# Altium footprint library USER_Lib.PcbLib: 109 footprints (part 7 of 7)
Each footprint in its own frame and in the unit in brackets; x right, y up, seen from the top. Pads: shape width x height; smd on the part's side, far side on the other; paste and mask are expansions set on the pad; w line width, h text height; cw(c..) or ccw(c..) is an arc to the next point about the centre after c.
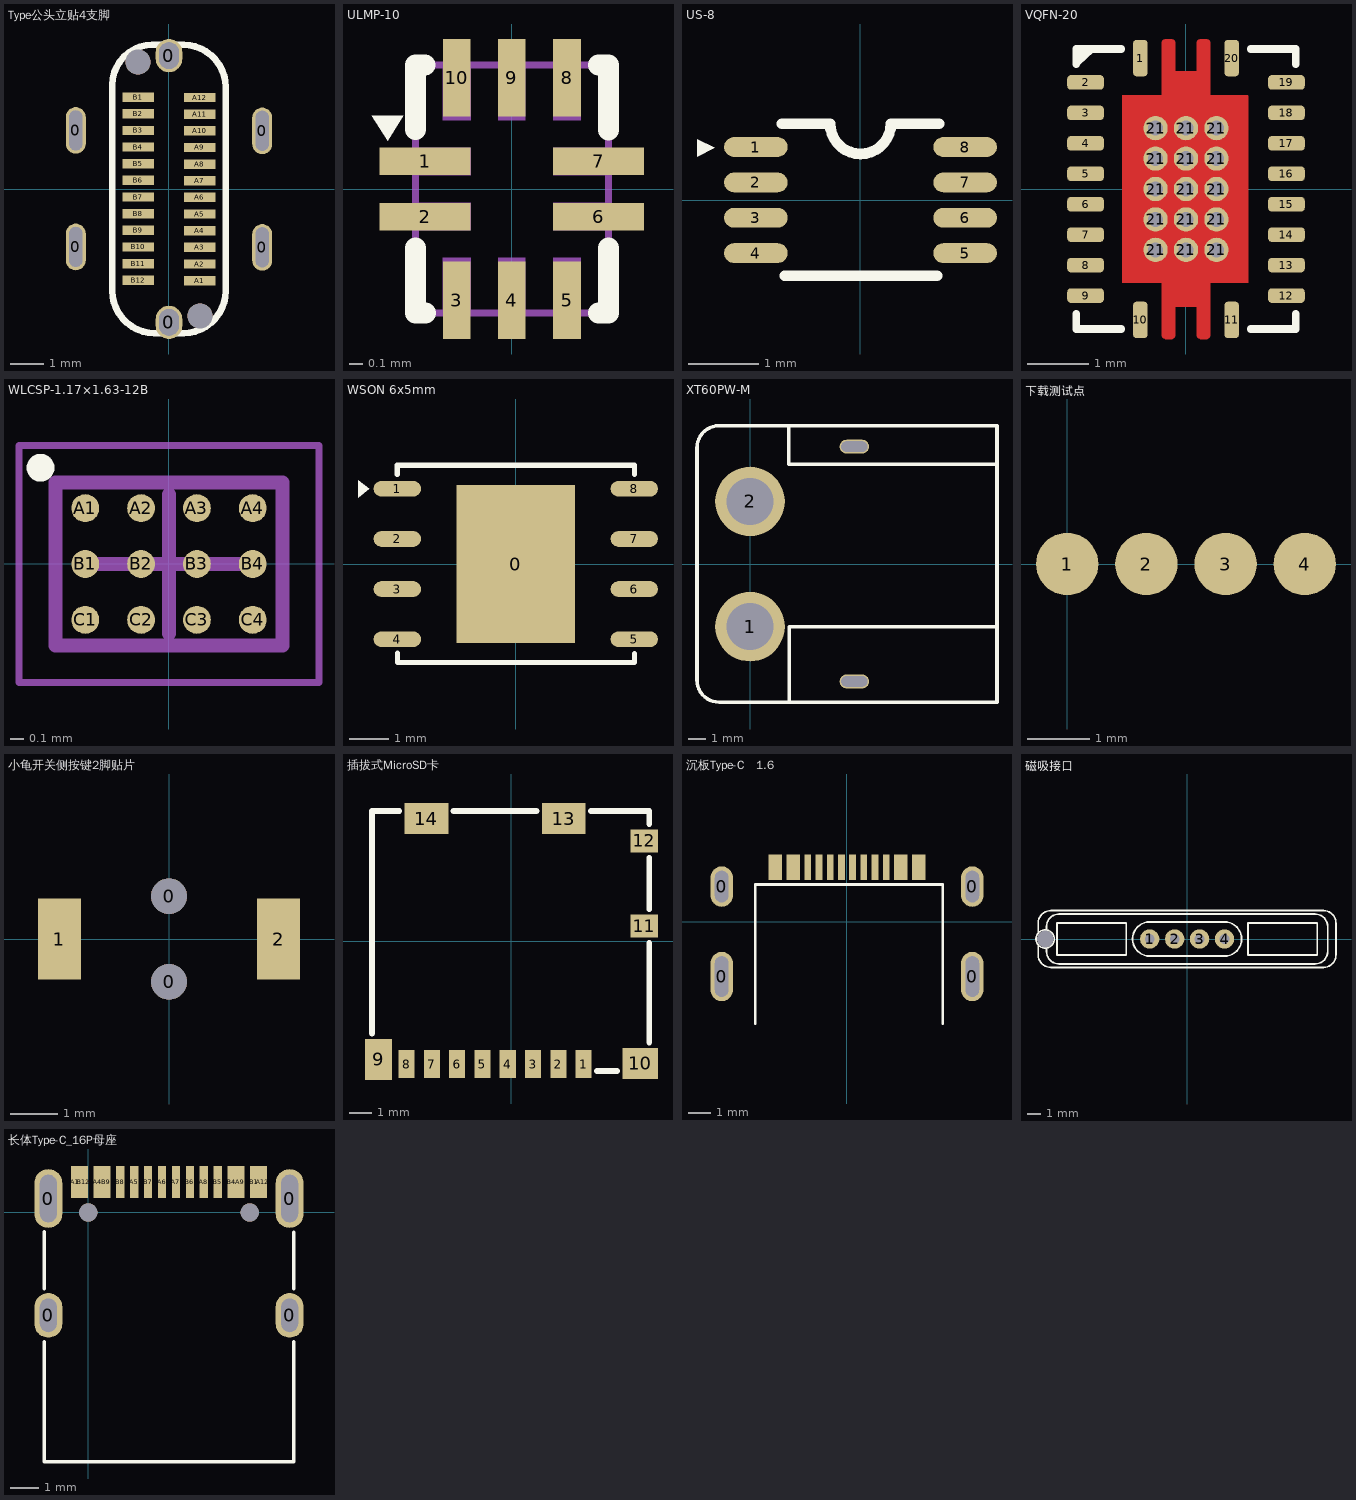
[diagram p6: the footprints below, top view; thin cyan lines are the x and y axes]

## Type公头立贴4支脚 [mm]
pads (32):
  oval 0.6x1.4 hole 0.4 slot 1.2 at 90 deg mask+0.102: 0(-2.8,-1.741) 0(-2.8,1.759) 0(2.8,-1.753) 0(2.8,1.747)
  oval 0.8x1 hole 0.6 slot 0.8 at 90 deg mask+0.102: 0(0,-4.005) 0(0,4.005)
  rect 0.95x0.28 smd mask+0.102: A1(0.925,-2.753) A2(0.925,-2.253) A3(0.925,-1.753) A4(0.925,-1.253) A5(0.925,-0.753) A6(0.925,-0.253) A7(0.925,0.247) A8(0.925,0.747) A9(0.925,1.247) A10(0.925,1.747) A11(0.925,2.247) A12(0.925,2.747) B1(-0.925,2.759) B2(-0.925,2.259) B3(-0.925,1.759) B4(-0.925,1.259) B5(-0.925,0.759) B6(-0.925,0.259) B7(-0.925,-0.241) B8(-0.925,-0.741) B9(-0.925,-1.241) B10(-0.925,-1.741) B11(-0.925,-2.241) B12(-0.925,-2.741)
  round 0.75 hole 0.75 unplated mask+0.102: ""(-0.93,3.81) ""(0.93,-3.81)
Top Overlay:
  lines w0.203: -1.702,-3.06 ccw(c-0.432,-3.06) -0.432,-4.33 0.432,-4.33 ccw(c0.432,-3.06) 1.702,-3.06 1.702,1.219 1.702,3.06 ccw(c0.432,3.06) 0.432,4.33 -0.496,4.33 ccw(c-0.496,3.124) -1.702,3.124 -1.702,-3.06

## ULMP-10 [mm]
pads (10):
  rect 0.663x0.201 smd mask+0.051: 1(-0.63,0.201) 2(-0.63,-0.201) 6(0.63,-0.201) 7(0.63,0.201)
  rect 0.201x0.564 smd mask+0.051: 3(-0.399,-0.808) 4(0,-0.808) 5(0.401,-0.808) 8(0.401,0.808) 9(0,0.808) 10(-0.399,0.808)
Top Overlay:
  region: -0.788,0.533 -0.902,0.351 -1.016,0.533
  lines w0.152: -0.701,-0.429 -0.701,-0.899 -0.627,-0.899 ; -0.701,0.434 -0.701,0.899 -0.631,0.899 ; 0.63,-0.899 0.701,-0.899 0.701,-0.428 ; 0.631,0.899 0.701,0.899 0.701,0.43
Mechanical 15:
  region: 0.099,0.899 0.099,0.5 -0.099,0.5 -0.099,0.899
  region: -0.3,0.899 -0.3,0.5 -0.5,0.5 -0.5,0.899
  region: 0.5,0.899 0.5,0.5 0.3,0.5 0.3,0.899
  region: -0.3,-0.5 -0.3,-0.899 -0.5,-0.899 -0.5,-0.5
  region: 0.099,-0.5 0.099,-0.899 -0.099,-0.899 -0.099,-0.5
  region: 0.5,-0.5 0.5,-0.899 0.3,-0.899 0.3,-0.5
  region: 0.701,0.3 0.3,0.3 0.3,0.099 0.701,0.099
  region: 0.701,-0.099 0.3,-0.099 0.3,-0.3 0.701,-0.3
  region: -0.701,-0.099 -0.3,-0.099 -0.3,-0.3 -0.701,-0.3
  region: -0.701,0.3 -0.3,0.3 -0.3,0.099 -0.701,0.099
  region: -0.701,0.838 -0.676,0.838 -0.64,0.874 -0.64,0.924 -0.676,0.96 -0.701,0.96 -0.726,0.96 -0.762,0.924 -0.762,0.874 -0.726,0.838
  lines w0.051: -0.701,-0.899 -0.701,0.899 0.701,0.899 0.701,-0.899 -0.701,-0.899
3D body "UMLP-10.STEP": height 0.51, standoff 0, extent -0.711,-0.905 0.708,0.915

## US-8 [mm]
pads (8):
  oval 0.9x0.28 smd: 1(-1.48,0.75) 2(-1.48,0.25) 3(-1.48,-0.25) 4(-1.48,-0.75) 5(1.48,-0.75) 6(1.48,-0.25) 7(1.48,0.25) 8(1.48,0.75)
Top Overlay:
  region: -2.311,0.864 -2.057,0.737 -2.311,0.61
  lines w0.152: -1.11,1.08 -0.43,1.08 ccw(c0,1.083) 0.431,1.08 ; -1.07,-1.07 1.08,-1.07 ; 0.43,1.08 1.11,1.08

## VQFN-20 [mm]
pads (35):
  rrect50% 0.24x0.6 smd: 1(-0.75,2.15) 10(-0.75,-2.15) 11(0.75,-2.15) 20(0.75,2.15)
  rrect50% 0.6x0.24 smd: 2(-1.65,1.75) 3(-1.65,1.25) 4(-1.65,0.75) 5(-1.65,0.25) 6(-1.65,-0.25) 7(-1.65,-0.75) 8(-1.65,-1.25) 9(-1.65,-1.75) 12(1.65,-1.75) 13(1.65,-1.25) 14(1.65,-0.75) 15(1.65,-0.25) 16(1.65,0.25) 17(1.65,0.75) 18(1.65,1.25) 19(1.65,1.75)
  round 0.4 hole 0.25 mask+0.102: 21(-0.5,-1) 21(-0.5,-0.5) 21(-0.5,0) 21(-0.5,0.5) 21(-0.5,1) 21(0,-1) 21(0,-0.5) 21(0,0) 21(0,0.5) 21(0,1) 21(0.5,-1) 21(0.5,-0.5) 21(0.5,0) 21(0.5,0.5) 21(0.5,1)
Top Layer:
  region: -1.038,-1.538 -0.401,-1.538 -0.401,-2.403 -0.401,-2.415 -0.391,-2.437 -0.375,-2.454 -0.353,-2.463 -0.341,-2.463 -0.234,-2.463 -0.222,-2.463 -0.2,-2.454 -0.184,-2.437 -0.174,-2.415 -0.174,-2.403 -0.174,-1.937 0.174,-1.937 0.174,-2.403 0.174,-2.415 0.184,-2.437 0.2,-2.454 0.222,-2.463 0.234,-2.463 0.341,-2.463 0.353,-2.463 0.375,-2.454 0.391,-2.437 0.401,-2.415 0.401,-2.403 0.401,-1.538 1.012,-1.538 1.015,-1.538 1.02,-1.536 1.024,-1.532 1.026,-1.528 1.026,-1.525 1.026,1.519 1.025,1.522 1.021,1.528 1.016,1.533 1.01,1.536 1.007,1.537 0.401,1.537 0.401,2.403 0.401,2.415 0.391,2.437 0.375,2.454 0.353,2.463 0.341,2.463 0.234,2.463 0.222,2.463 0.2,2.454 0.184,2.437 0.174,2.415 0.174,2.403 0.174,1.937 -0.174,1.937 -0.174,2.403 -0.174,2.415 -0.184,2.437 -0.2,2.454 -0.222,2.463 -0.234,2.463 -0.341,2.463 -0.353,2.463 -0.375,2.454 -0.391,2.437 -0.401,2.415 -0.401,2.403 -0.401,1.538 -1.038,1.538 -1.04,1.538 -1.045,1.536 -1.049,1.532 -1.051,1.528 -1.051,1.525 -1.051,-1.525 -1.051,-1.528 -1.049,-1.532 -1.045,-1.536 -1.04,-1.538
Top Overlay:
  lines w0.127: -1.801,-2.048 -1.801,-2.301 -1.062,-2.301 ; -1.801,2.048 -1.801,2.301 -1.062,2.301 ; -1.792,2.157 -1.646,2.283 ; -1.788,2.081 -1.56,2.297 ; 1.062,-2.301 1.801,-2.301 1.801,-2.048 ; 1.062,2.301 1.801,2.301 1.801,2.048
Top Solder:
  region: -1.038,-1.538 -0.401,-1.538 -0.401,-2.403 -0.401,-2.415 -0.391,-2.437 -0.375,-2.454 -0.353,-2.463 -0.341,-2.463 -0.234,-2.463 -0.222,-2.463 -0.2,-2.454 -0.184,-2.437 -0.174,-2.415 -0.174,-2.403 -0.174,-1.937 0.174,-1.937 0.174,-2.403 0.174,-2.415 0.184,-2.437 0.2,-2.454 0.222,-2.463 0.234,-2.463 0.341,-2.463 0.353,-2.463 0.375,-2.454 0.391,-2.437 0.401,-2.415 0.401,-2.403 0.401,-1.538 1.012,-1.538 1.015,-1.538 1.02,-1.536 1.024,-1.532 1.026,-1.528 1.026,-1.525 1.026,1.519 1.025,1.522 1.021,1.528 1.016,1.533 1.01,1.536 1.007,1.537 0.401,1.537 0.401,2.403 0.401,2.415 0.391,2.437 0.375,2.454 0.353,2.463 0.341,2.463 0.234,2.463 0.222,2.463 0.2,2.454 0.184,2.437 0.174,2.415 0.174,2.403 0.174,1.937 -0.174,1.937 -0.174,2.403 -0.174,2.415 -0.184,2.437 -0.2,2.454 -0.222,2.463 -0.234,2.463 -0.341,2.463 -0.353,2.463 -0.375,2.454 -0.391,2.437 -0.401,2.415 -0.401,2.403 -0.401,1.538 -1.038,1.538 -1.04,1.538 -1.045,1.536 -1.049,1.532 -1.051,1.528 -1.051,1.525 -1.051,-1.525 -1.051,-1.528 -1.049,-1.532 -1.045,-1.536 -1.04,-1.538
3D body "VQFN-20.STEP": height 1, standoff 0, extent -1.8,-2.3 1.8,2.3

## WLCSP-1.17×1.63-12B [mm] "BGA, 12-Leads, Body 1.63x1.17mmx0.69mm, Pitch 0.40mm"
height 0.69
pads (12):
  round 0.2 smd: A1(-0.6,0.4) A2(-0.2,0.4) A3(0.2,0.4) A4(0.6,0.4) B1(-0.6,0) B2(-0.2,0) B3(0.2,0) B4(0.6,0) C1(-0.6,-0.4) C2(-0.2,-0.4) C3(0.2,-0.4) C4(0.6,-0.4)
Top Overlay:
  circle w0.1: c-0.92,0.69 r0.05
Mechanical 13:
  lines w0.1: -0.815,-0.585 0.815,-0.585 0.815,0.585 -0.815,0.585 -0.815,-0.585
Mechanical 15:
  lines w0.05: -1.075,-0.85 1.075,-0.85 1.075,0.85 -1.075,0.85 -1.075,-0.85
  lines w0.1: -0.5,0 0.5,0 ; 0,-0.5 0,0.5
3D body "BGA12C40P4X3_163X117X69.step": height 0.69, standoff 0, extent -0.815,-0.585 0.815,0.585

## WSON 6x5mm [mm]
pads (9):
  rect 3x4 smd: 0(0,0)
  oval 1.2x0.4 smd: 1(-3,1.905) 2(-3,0.635) 3(-3,-0.635) 4(-3,-1.905) 5(3,-1.905) 6(3,-0.635) 7(3,0.635) 8(3,1.905)
Top Overlay:
  region: -3.995,2.124 -3.995,1.682 -3.716,1.903
  lines w0.127: -3.002,2.264 -3.002,2.5 3,2.5 3,2.27 ; -3,-2.253 -3,-2.5 3,-2.5 3,-2.271
3D body "WSON 6x5mm.STEP": height 0.75, standoff 0, extent -3,-2.5 3,2.5

## XT60PW-M [mm]
pads (4):
  round 4 hole 2.7: 1(0,-3.6) 2(0,3.6)
  oval 1.7x0.8 hole 0.6 slot 1.5 at 0 deg: ""(6,-6.75) ""(6,6.75)
Top Overlay:
  lines w0.203: 2.235,7.899 2.235,5.75 14.157,5.75 ; 2.261,-7.95 2.261,-3.6 14.192,-3.6 ; -3.048,-6.673 ccw(c-1.778,-6.673) -1.778,-7.943 14.202,-7.943 14.202,7.957 -1.778,7.957 ccw(c-1.778,6.687) -3.048,6.687 -3.048,-6.673

## 下载测试点 [mm]
pads (4):
  round 1 smd: 1(0,0) 2(1.27,0) 3(2.54,0) 4(3.81,0)

## 小龟开关侧按键2脚贴片 [mm] "3*4 白色 带定位柱"
pads (4):
  round 0.75 hole 0.75 unplated mask+0.102: 0(0,-0.9) 0(0,0.9)
  rect 0.9x1.7 smd mask+0.102: 1(-2.3,0) 2(2.3,0)
3D body "BUTTON 小龟侧贴按键2脚.STEP": height 1.5, standoff -0.5, extent -2.5,-1.95 2.5,1.45

## 插拔式MicroSD卡 [mm]
pads (14):
  rect 0.7x1.2 smd: 1(3.138,-5.338) 2(2.038,-5.338) 3(0.938,-5.338) 4(-0.162,-5.338) 5(-1.262,-5.338) 6(-2.362,-5.338) 7(-3.463,-5.338) 8(-4.562,-5.337)
  rect 1.17x1.8 smd: 9(-5.773,-5.138)
  rect 1.55x1.35 smd: 10(5.598,-5.312)
  rect 1.2x1 smd: 11(5.773,0.663) 12(5.773,4.363)
  rect 1.9x1.35 smd: 13(2.273,5.338) 14(-3.697,5.338)
Top Overlay:
  lines w0.254: -6.071,-4.009 -6.071,5.665 -4.879,5.665 ; -2.516,5.665 1.091,5.665 ; 3.454,5.665 5.994,5.665 5.994,5.094 ; 3.723,-5.638 4.591,-5.638 ; 5.994,-4.406 5.994,-0.069 ; 5.994,1.394 5.994,3.631
3D body "TF.STEP": height 1.44, standoff -0.03, extent -5.949,-5.74 6,5.659

## 沉板Type-C   1.6 [mm]
pads (20):
  oval 1x2.2 hole 0.6 slot 1.8 at 90 deg mask+0.102: 0(-5.575,-2.432) 0(5.575,-2.432)
  oval 1x1.8 hole 0.6 slot 1.4 at 90 deg mask+0.102: 0(-5.575,1.572) 0(5.575,1.572)
  rect 0.3x1.15 smd: A1(-3.352,2.432) A4(-2.552,2.432) A5(-1.25,2.432) A6(-0.25,2.432) A7(0.25,2.432) A8(-1.75,2.432) A9(2.552,2.432) A12(3.352,2.432) B1(3.052,2.432) B4(2.252,2.432) B5(1.75,2.432) B6(0.75,2.432) B7(-0.75,2.432) B8(1.25,2.432) B9(-2.252,2.432) B12(-3.052,2.432)
Top Overlay:
  lines w0.127: -4.08,1.668 4.26,1.668 4.26,1.668 ; -4.08,1.668 -4.08,-4.532 -4.08,1.668 ; 4.26,-4.532 4.26,1.668 ; 4.26,-4.532 4.26,1.668 ; 4.26,-4.532 4.26,1.668
3D body "type-c.stp": height 1.86, standoff -1.3, extent -5.515,-4.532 5.725,2.668

## 磁吸接口 [mm] "4Pin 磁吸接口"
pads (5):
  round 0 hole 1.2 unplated mask+0.102: 0(-10.25,0)
  round 1.4 hole 0.7 mask+0.102: 1(-2.7,0) 2(-0.9,0) 3(0.9,0) 4(2.7,0)
Top Overlay:
  circle w0.127: c-10.25,0 r0.659
  lines w0.127: -10.75,-0.437 -10.75,-1.15 ccw(c-9.85,-1.15) -9.85,-2.05 9.85,-2.05 ccw(c9.85,-1.15) 10.75,-1.15 10.75,1.15 ccw(c9.85,1.15) 9.85,2.05 -9.85,2.05 ccw(c-9.85,1.15) -10.75,1.15 -10.75,0.442 ; -10.15,-0.9 ccw(c-9.25,-0.9) -9.25,-1.8 ; -10.15,-0.9 ccw(c-9.25,-0.9) -9.25,-1.8 ; -10.15,-0.9 -10.154,-0.655 -10.15,-0.9 ; -10.15,0.9 cw(c-9.25,0.9) -9.25,1.8 ; -10.15,0.9 cw(c-9.25,0.9) -9.25,1.8 ; -10.15,0.9 -10.15,0.657 -10.15,0.9 ; -9.25,-1.8 9.25,-1.8 ; -9.25,-1.8 9.25,-1.8 ; -9.25,1.8 9.25,1.8 ; 9.25,-1.8 ccw(c9.25,-0.9) 10.15,-0.9 ; 9.25,-1.8 ccw(c9.25,-0.9) 10.15,-0.9 ; 9.25,1.8 cw(c9.25,0.9) 10.15,0.9 ; 9.25,1.8 cw(c9.25,0.9) 10.15,0.9 ; 10.15,-0.9 10.15,0.9 ; -9.4,-1.15 -4.4,-1.15 -4.4,1.15 -9.4,1.15 -9.4,-1.15 ; -3.935,0 ccw(c-2.7,0) -2.7,-1.235 2.7,-1.235 ccw(c2.7,0) 3.935,0 ccw(c2.7,0) 2.7,1.235 -2.7,1.235 ccw(c-2.7,0) -3.935,0 ; 4.4,-1.15 9.4,-1.15 9.4,1.15 4.4,1.15 4.4,-1.15

## 长体Type-C_16P母座 [mm] "Type-C  16P母座  长体10.0L"
pads (22):
  oval 1x1.6 hole 0.6 slot 1.2 at 90 deg mask+0.102: 0(-1.43,-3.68) 0(7.21,-3.68)
  oval 1x2.1 hole 0.6 slot 1.7 at 90 deg mask+0.102: 0(-1.43,0.5) 0(7.21,0.5)
  rect 0.3x1.15 smd mask+0.102: A1(-0.46,1.085) A4(0.34,1.085) A5(1.64,1.085) A6(2.64,1.085) A7(3.14,1.085) A8(4.14,1.085) A9(5.44,1.085) A12(6.24,1.085) B1(5.94,1.085) B4(5.14,1.085) B5(4.64,1.085) B6(3.64,1.085) B7(2.14,1.085) B8(1.14,1.085) B9(0.64,1.085) B12(-0.16,1.085)
  round 0.65 hole 0.65 unplated mask+0.102: ""(0,0) ""(5.78,0)
Top Overlay:
  lines w0.127: -1.58,-4.628 -1.58,-8.929 7.36,-8.929 7.36,-4.631 ; -1.58,-2.732 -1.58,-0.698 ; 7.359,-2.731 7.359,-0.7
3D body "tupe-c.stp": height 3.21, standoff -1, extent -1.58,-8.93 7.36,1.32